# Altium schematic symbol library Oscillators - Crystals.SchLib: 746 symbols (part 4 of 5)
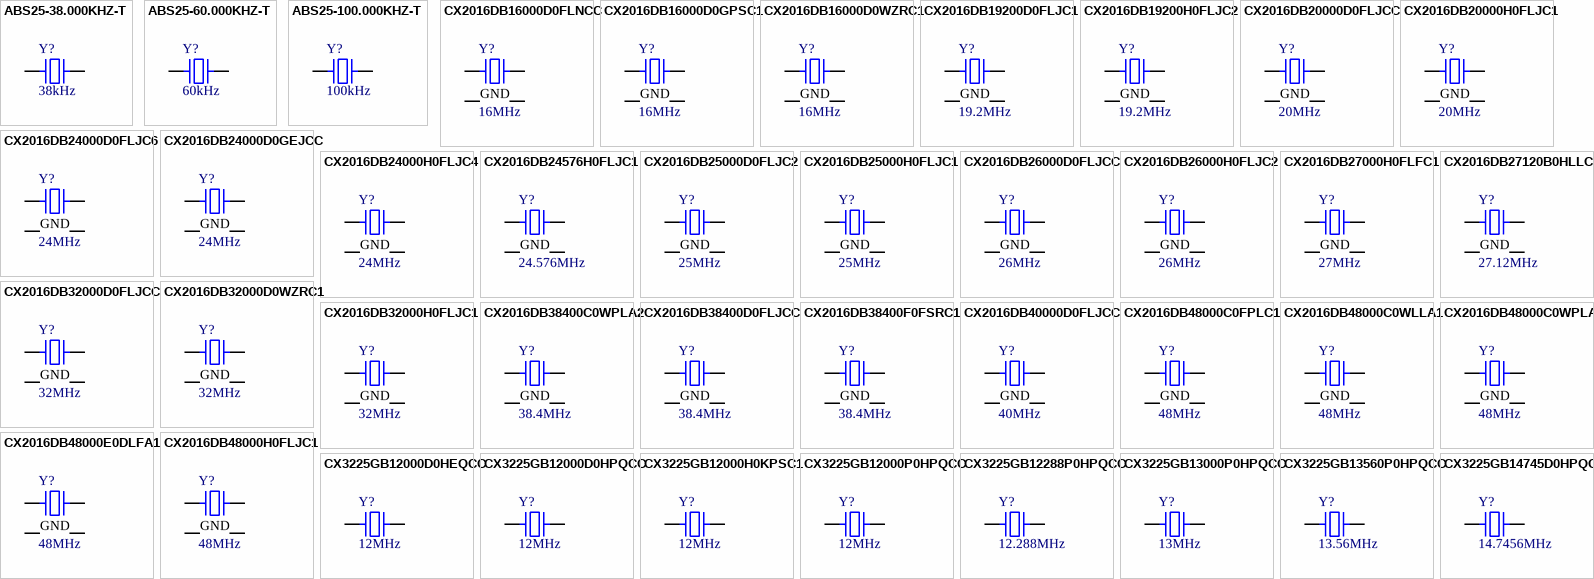
[diagram p21: symbols ABS25-38.000KHZ-T to CX3225GB14745D0HPQCC]

## CX2016DB24000D0FLJC6
designator Y?, comment 24MHz
CRYSTAL 24.0000MHZ 8PF SMD; Part Number: CX2016DB24000D0FLJC6; Manufacturer: Kyocera International Inc. Electronic Components; ESR (Equivalent Series Resistance): 150 Ohms; Frequency Stability: ±15ppm; Frequency Tolerance: ±10ppm; Operating Mode: Fundamental; ComponentLink1Description: Datasheet; ComponentLink1URL: //media.digikey.com/pdf/Data%20Sheets/AVX%20PDFs/CX2016DB_USY1M-H1-16424-00_Spec.pdf; ComponentLink2Description: DigiKey Link; ComponentLink2URL: http://digikey.com/product-detail/en/kyocera-international-inc-electronic-components/CX2016DB24000D0FLJC6/1253-1705-1-ND/6123332; Frequency: 24MHz; Height - Seated (Max): 0.018" (0.45mm); LastUpdated: 9/2/2020 1:21:56 AM; Lifecycle Status: Active; Load Capacitance: 8pF; Minimum Order: 1; Mounting Type: Surface Mount; Operating Temperature: -30°C ~ 85°C; Package / Case: 4-SMD, No Lead; Packaging: TapeAndReel; PartId: 456; Part Status: Active; Price: 0.36; Series: CX2016DB, Kyocera; Size / Dimension: 0.079" L x 0.063" W (2.00mm x 1.60mm); Supplier 1: DigiKey; Supplier Part Number 1: 1253-1705-1-ND; Type: MHz Crystal; Value: 24MHz
footprint KYOCERA CX2016DB
pins: 1, 2 GND, 3, 4 GND

## CX2016DB24000D0GEJCC
designator Y?, comment 24MHz
CRYSTAL 24.0000MHZ 8PF SMD; Part Number: CX2016DB24000D0GEJCC; Manufacturer: Kyocera International Inc. Electronic Components; ESR (Equivalent Series Resistance): 150 Ohms; Frequency Stability: ±15ppm; Operating Mode: Fundamental; ComponentLink1Description: Datasheet; ComponentLink1URL: https://global.kyocera.com/prdct/electro/product/pdf/cx2016db_e.pdf; ComponentLink2Description: DigiKey Link; ComponentLink2URL: http://digikey.com/product-detail/en/kyocera-international-inc-electronic-components/CX2016DB24000D0GEJCC/1253-1114-1-ND/4453932; Frequency: 24MHz; Frequency Tolerance: ±15ppm; Height - Seated (Max): 0.018" (0.45mm); LastUpdated: 9/2/2020 1:21:56 AM; Lifecycle Status: Active; Load Capacitance: 8pF; Minimum Order: 1; Mounting Type: Surface Mount; Operating Temperature: -10°C ~ 70°C; Package / Case: 4-SMD, No Lead; Packaging: TapeAndReel; PartId: 469; Part Status: Active; Price: 0.45; Series: CX2016DB, Kyocera; Size / Dimension: 0.079" L x 0.063" W (2.00mm x 1.60mm); Supplier 1: DigiKey; Supplier Part Number 1: 1253-1114-1-ND; Type: MHz Crystal; Value: 24MHz
footprint KYOCERA CX2016DB
pins: 1, 2 GND, 3, 4 GND

## CX2016DB24000H0FLJC4
designator Y?, comment 24MHz
CRYSTAL 24.0000MHZ 12PF SMD; Part Number: CX2016DB24000H0FLJC4; Manufacturer: Kyocera International Inc. Electronic Components; ESR (Equivalent Series Resistance): 150 Ohms; Frequency Stability: ±15ppm; Frequency Tolerance: ±10ppm; Operating Mode: Fundamental; ComponentLink1Description: Datasheet; ComponentLink1URL: //media.digikey.com/pdf/Data%20Sheets/AVX%20PDFs/CX2016DB_USY1M-H1-16426-00_Spec.pdf; ComponentLink2Description: DigiKey Link; ComponentLink2URL: http://digikey.com/product-detail/en/kyocera-international-inc-electronic-components/CX2016DB24000H0FLJC4/1253-1706-1-ND/6123333; Frequency: 24MHz; Height - Seated (Max): 0.018" (0.45mm); LastUpdated: 9/2/2020 1:21:56 AM; Lifecycle Status: Active; Load Capacitance: 12pF; Minimum Order: 1; Mounting Type: Surface Mount; Operating Temperature: -30°C ~ 85°C; Package / Case: 4-SMD, No Lead; Packaging: TapeAndReel; PartId: 476; Part Status: Active; Price: 0.36; Series: CX2016DB, Kyocera; Size / Dimension: 0.079" L x 0.063" W (2.00mm x 1.60mm); Supplier 1: DigiKey; Supplier Part Number 1: 1253-1706-1-ND; Type: MHz Crystal; Value: 24MHz
footprint KYOCERA CX2016DB
pins: 1, 2 GND, 3, 4 GND

## CX2016DB24576H0FLJC1
designator Y?, comment 24.576MHz
CRYSTAL 24.5760MHZ 12PF SMD; Part Number: CX2016DB24576H0FLJC1; Manufacturer: Kyocera International Inc. Electronic Components; ESR (Equivalent Series Resistance): 150 Ohms; Frequency Stability: ±15ppm; Frequency Tolerance: ±10ppm; Operating Mode: Fundamental; ComponentLink1Description: Datasheet; ComponentLink1URL: //media.digikey.com/pdf/Data%20Sheets/AVX%20PDFs/CX2016DB_USY1M-H1-16426-00_Spec.pdf; ComponentLink2Description: DigiKey Link; ComponentLink2URL: http://digikey.com/product-detail/en/kyocera-international-inc-electronic-components/CX2016DB24576H0FLJC1/1253-1707-1-ND/6123334; Frequency: 24.576MHz; Height - Seated (Max): 0.018" (0.45mm); LastUpdated: 9/2/2020 1:21:56 AM; Lifecycle Status: Active; Load Capacitance: 12pF; Minimum Order: 1; Mounting Type: Surface Mount; Operating Temperature: -30°C ~ 85°C; Package / Case: 4-SMD, No Lead; Packaging: TapeAndReel; PartId: 457; Part Status: Active; Price: 0.36; Series: CX2016DB, Kyocera; Size / Dimension: 0.079" L x 0.063" W (2.00mm x 1.60mm); Supplier 1: DigiKey; Supplier Part Number 1: 1253-1707-1-ND; Type: MHz Crystal; Value: 24.576MHz
footprint KYOCERA CX2016DB
pins: 1, 2 GND, 3, 4 GND

## CX2016DB25000D0FLJC2
designator Y?, comment 25MHz
CRYSTAL 25.0000MHZ 8PF SMD; Part Number: CX2016DB25000D0FLJC2; Manufacturer: Kyocera International Inc. Electronic Components; ESR (Equivalent Series Resistance): 150 Ohms; Frequency Stability: ±15ppm; Frequency Tolerance: ±10ppm; Operating Mode: Fundamental; ComponentLink1Description: Datasheet; ComponentLink1URL: //media.digikey.com/pdf/Data%20Sheets/AVX%20PDFs/CX2016DB_USY1M-H1-16424-00_Spec.pdf; ComponentLink2Description: DigiKey Link; ComponentLink2URL: http://digikey.com/product-detail/en/kyocera-international-inc-electronic-components/CX2016DB25000D0FLJC2/1253-1708-1-ND/6123335; Frequency: 25MHz; Height - Seated (Max): 0.018" (0.45mm); LastUpdated: 9/2/2020 1:21:56 AM; Lifecycle Status: Active; Load Capacitance: 8pF; Minimum Order: 1; Mounting Type: Surface Mount; Operating Temperature: -30°C ~ 85°C; Package / Case: 4-SMD, No Lead; Packaging: TapeAndReel; PartId: 484; Part Status: Active; Price: 0.36; Series: CX2016DB, Kyocera; Size / Dimension: 0.079" L x 0.063" W (2.00mm x 1.60mm); Supplier 1: DigiKey; Supplier Part Number 1: 1253-1708-1-ND; Type: MHz Crystal; Value: 25MHz
footprint KYOCERA CX2016DB
pins: 1, 2 GND, 3, 4 GND

## CX2016DB25000H0FLJC1
designator Y?, comment 25MHz
CRYSTAL 25.0000MHZ 12PF SMD; Part Number: CX2016DB25000H0FLJC1; Manufacturer: Kyocera International Inc. Electronic Components; ESR (Equivalent Series Resistance): 150 Ohms; Frequency Stability: ±15ppm; Frequency Tolerance: ±10ppm; Operating Mode: Fundamental; ComponentLink1Description: Datasheet; ComponentLink1URL: //media.digikey.com/pdf/Data%20Sheets/AVX%20PDFs/CX2016DB_USY1M-H1-16426-00_Spec.pdf; ComponentLink2Description: DigiKey Link; ComponentLink2URL: http://digikey.com/product-detail/en/kyocera-international-inc-electronic-components/CX2016DB25000H0FLJC1/1253-1709-1-ND/6123336; Frequency: 25MHz; Height - Seated (Max): 0.018" (0.45mm); LastUpdated: 9/2/2020 1:21:56 AM; Lifecycle Status: Active; Load Capacitance: 12pF; Minimum Order: 1; Mounting Type: Surface Mount; Operating Temperature: -30°C ~ 85°C; Package / Case: 4-SMD, No Lead; Packaging: TapeAndReel; PartId: 458; Part Status: Active; Price: 0.36; Series: CX2016DB, Kyocera; Size / Dimension: 0.079" L x 0.063" W (2.00mm x 1.60mm); Supplier 1: DigiKey; Supplier Part Number 1: 1253-1709-1-ND; Type: MHz Crystal; Value: 25MHz
footprint KYOCERA CX2016DB
pins: 1, 2 GND, 3, 4 GND

## CX2016DB26000D0FLJCC
designator Y?, comment 26MHz
CRYSTAL 26.0000MHZ 8PF SMD; Part Number: CX2016DB26000D0FLJCC; Manufacturer: Kyocera International Inc. Electronic Components; ESR (Equivalent Series Resistance): 60 Ohms; Frequency Stability: ±15ppm; Frequency Tolerance: ±10ppm; Operating Mode: Fundamental; ComponentLink1Description: Datasheet; ComponentLink1URL: //media.digikey.com/pdf/Data%20Sheets/Optrex%20PDFs/CX2016DB_Series_Spec.pdf; ComponentLink2Description: DigiKey Link; ComponentLink2URL: http://digikey.com/product-detail/en/kyocera-international-inc-electronic-components/CX2016DB26000D0FLJCC/1253-1116-1-ND/4453935; Frequency: 26MHz; Height - Seated (Max): 0.018" (0.45mm); LastUpdated: 9/2/2020 1:21:56 AM; Lifecycle Status: Active; Load Capacitance: 8pF; Minimum Order: 1; Mounting Type: Surface Mount; Operating Temperature: -30°C ~ 85°C; Package / Case: 4-SMD, No Lead; Packaging: TapeAndReel; PartId: 473; Part Status: Active; Price: 0.48; Series: CX2016DB, Kyocera; Size / Dimension: 0.079" L x 0.063" W (2.00mm x 1.60mm); Supplier 1: DigiKey; Supplier Part Number 1: 1253-1116-1-ND; Type: MHz Crystal; Value: 26MHz
footprint KYOCERA CX2016DB
pins: 1, 2 GND, 3, 4 GND

## CX2016DB26000H0FLJC2
designator Y?, comment 26MHz
CRYSTAL 26.0000MHZ 12PF SMD; Part Number: CX2016DB26000H0FLJC2; Manufacturer: Kyocera International Inc. Electronic Components; ESR (Equivalent Series Resistance): 60 Ohms; Frequency Stability: ±15ppm; Frequency Tolerance: ±10ppm; Operating Mode: Fundamental; ComponentLink1Description: Datasheet; ComponentLink1URL: //media.digikey.com/pdf/Data%20Sheets/AVX%20PDFs/CX2016DB_USY1M-H1-16426-00_Spec.pdf; ComponentLink2Description: DigiKey Link; ComponentLink2URL: http://digikey.com/product-detail/en/kyocera-international-inc-electronic-components/CX2016DB26000H0FLJC2/1253-1710-1-ND/6123337; Frequency: 26MHz; Height - Seated (Max): 0.018" (0.45mm); LastUpdated: 9/2/2020 1:21:56 AM; Lifecycle Status: Active; Load Capacitance: 12pF; Minimum Order: 1; Mounting Type: Surface Mount; Operating Temperature: -30°C ~ 85°C; Package / Case: 4-SMD, No Lead; Packaging: TapeAndReel; PartId: 475; Part Status: Active; Price: 0.36; Series: CX2016DB, Kyocera; Size / Dimension: 0.079" L x 0.063" W (2.00mm x 1.60mm); Supplier 1: DigiKey; Supplier Part Number 1: 1253-1710-1-ND; Type: MHz Crystal; Value: 26MHz
footprint KYOCERA CX2016DB
pins: 1, 2 GND, 3, 4 GND

## CX2016DB27000H0FLFC1
designator Y?, comment 27MHz
CRYSTAL 27.0000MHZ 12PF SMD; Part Number: CX2016DB27000H0FLFC1; Manufacturer: Kyocera International Inc. Electronic Components; ESR (Equivalent Series Resistance): 60 Ohms; Frequency Stability: ±15ppm; Frequency Tolerance: ±10ppm; Operating Mode: Fundamental; ComponentLink1Description: Datasheet; ComponentLink1URL: https://global.kyocera.com/prdct/electro/product/pdf/cx2016db_e.pdf; ComponentLink2Description: DigiKey Link; ComponentLink2URL: http://digikey.com/product-detail/en/kyocera-international-inc-electronic-components/CX2016DB27000H0FLFC1/1253-1347-1-ND/4896437; Frequency: 27MHz; Height - Seated (Max): 0.018" (0.45mm); LastUpdated: 9/2/2020 1:21:56 AM; Lifecycle Status: Active; Load Capacitance: 12pF; Minimum Order: 1; Mounting Type: Surface Mount; Operating Temperature: -30°C ~ 85°C; Package / Case: 4-SMD, No Lead; Packaging: TapeAndReel; PartId: 482; Part Status: Active; Price: 0.33; Series: CX2016DB, Kyocera; Size / Dimension: 0.079" L x 0.063" W (2.00mm x 1.60mm); Supplier 1: DigiKey; Supplier Part Number 1: 1253-1347-1-ND; Type: MHz Crystal; Value: 27MHz
footprint KYOCERA CX2016DB
pins: 1, 2 GND, 3, 4 GND

## CX2016DB27120B0HLLC1
designator Y?, comment 27.12MHz
CRYSTAL 27.1200MHZ 6PF SMD; Part Number: CX2016DB27120B0HLLC1; Manufacturer: Kyocera International Inc. Electronic Components; ESR (Equivalent Series Resistance): 60 Ohms; Frequency Tolerance: ±20ppm; Operating Mode: Fundamental; ComponentLink2Description: DigiKey Link; ComponentLink2URL: http://digikey.com/product-detail/en/kyocera-international-inc-electronic-components/CX2016DB27120B0HLLC1/1253-1697-1-ND/5995244; Frequency: 27.12MHz; Height - Seated (Max): 0.018" (0.45mm); LastUpdated: 9/2/2020 1:21:56 AM; Lifecycle Status: Active; Load Capacitance: 6pF; Minimum Order: 1; Mounting Type: Surface Mount; Operating Temperature: -30°C ~ 85°C; Package / Case: 4-SMD, No Lead; Packaging: TapeAndReel; PartId: 463; Part Status: Active; Price: 0.30; Series: CX2016DB, Kyocera; Size / Dimension: 0.079" L x 0.063" W (2.00mm x 1.60mm); Supplier 1: DigiKey; Supplier Part Number 1: 1253-1697-1-ND; Type: MHz Crystal; Value: 27.12MHz
footprint KYOCERA CX2016DB
pins: 1, 2 GND, 3, 4 GND

## CX2016DB32000D0FLJCC
designator Y?, comment 32MHz
CRYSTAL 32.0000MHZ 8PF SMD; Part Number: CX2016DB32000D0FLJCC; Manufacturer: Kyocera International Inc. Electronic Components; ESR (Equivalent Series Resistance): 60 Ohms; Frequency Stability: ±15ppm; Frequency Tolerance: ±10ppm; Operating Mode: Fundamental; ComponentLink1Description: Datasheet; ComponentLink1URL: //media.digikey.com/pdf/Data%20Sheets/Optrex%20PDFs/CX2016DB_Series_Spec.pdf; ComponentLink2Description: DigiKey Link; ComponentLink2URL: http://digikey.com/product-detail/en/kyocera-international-inc-electronic-components/CX2016DB32000D0FLJCC/1253-1118-1-ND/4453936; Frequency: 32MHz; Height - Seated (Max): 0.018" (0.45mm); LastUpdated: 9/2/2020 1:21:56 AM; Lifecycle Status: Active; Load Capacitance: 8pF; Minimum Order: 1; Mounting Type: Surface Mount; Operating Temperature: -30°C ~ 85°C; Package / Case: 4-SMD, No Lead; Packaging: TapeAndReel; PartId: 470; Part Status: Active; Price: 0.48; Series: CX2016DB, Kyocera; Size / Dimension: 0.079" L x 0.063" W (2.00mm x 1.60mm); Supplier 1: DigiKey; Supplier Part Number 1: 1253-1118-1-ND; Type: MHz Crystal; Value: 32MHz
footprint KYOCERA CX2016DB
pins: 1, 2 GND, 3, 4 GND

## CX2016DB32000D0WZRC1
designator Y?, comment 32MHz
CRYSTAL 32.0000MHZ 8PF SMD; Part Number: CX2016DB32000D0WZRC1; Manufacturer: Kyocera International Inc. Electronic Components; ESR (Equivalent Series Resistance): 60 Ohms; Frequency Stability: ±40ppm; Frequency Tolerance: ±25ppm; Operating Mode: Fundamental; ComponentLink1Description: Datasheet; ComponentLink1URL: https://global.kyocera.com/prdct/electro/product/pdf/cx2016db_e.pdf; ComponentLink2Description: DigiKey Link; ComponentLink2URL: http://digikey.com/product-detail/en/kyocera-international-inc-electronic-components/CX2016DB32000D0WZRC1/1253-1586-1-ND/5436848; Frequency: 32MHz; Height - Seated (Max): 0.018" (0.45mm); LastUpdated: 9/2/2020 1:21:56 AM; Lifecycle Status: Active; Load Capacitance: 8pF; Minimum Order: 1; Mounting Type: Surface Mount; Operating Temperature: -25°C ~ 75°C; Package / Case: 4-SMD, No Lead; Packaging: TapeAndReel; PartId: 466; Part Status: Active; Price: 0.36; Series: CX2016DB, Kyocera; Size / Dimension: 0.079" L x 0.063" W (2.00mm x 1.60mm); Supplier 1: DigiKey; Supplier Part Number 1: 1253-1586-1-ND; Type: MHz Crystal; Value: 32MHz
footprint KYOCERA CX2016DB
pins: 1, 2 GND, 3, 4 GND

## CX2016DB32000H0FLJC1
designator Y?, comment 32MHz
CRYSTAL 32.0000MHZ 12PF SMD; Part Number: CX2016DB32000H0FLJC1; Manufacturer: Kyocera International Inc. Electronic Components; ESR (Equivalent Series Resistance): 60 Ohms; Frequency Stability: ±15ppm; Frequency Tolerance: ±10ppm; Operating Mode: Fundamental; ComponentLink1Description: Datasheet; ComponentLink1URL: //media.digikey.com/pdf/Data%20Sheets/AVX%20PDFs/CX2016DB_USY1M-H1-16426-00_Spec.pdf; ComponentLink2Description: DigiKey Link; ComponentLink2URL: http://digikey.com/product-detail/en/kyocera-international-inc-electronic-components/CX2016DB32000H0FLJC1/1253-1711-1-ND/6123338; Frequency: 32MHz; Height - Seated (Max): 0.018" (0.45mm); LastUpdated: 9/2/2020 1:21:56 AM; Lifecycle Status: Active; Load Capacitance: 12pF; Minimum Order: 1; Mounting Type: Surface Mount; Operating Temperature: -30°C ~ 85°C; Package / Case: 4-SMD, No Lead; Packaging: TapeAndReel; PartId: 478; Part Status: Active; Price: 0.36; Series: CX2016DB, Kyocera; Size / Dimension: 0.079" L x 0.063" W (2.00mm x 1.60mm); Supplier 1: DigiKey; Supplier Part Number 1: 1253-1711-1-ND; Type: MHz Crystal; Value: 32MHz
footprint KYOCERA CX2016DB
pins: 1, 2 GND, 3, 4 GND

## CX2016DB38400C0WPLA2
designator Y?, comment 38.4MHz
CRYSTAL 38.4000MHZ 7PF SMD; Part Number: CX2016DB38400C0WPLA2; Manufacturer: Kyocera International Inc. Electronic Components; ESR (Equivalent Series Resistance): 60 Ohms; Frequency Stability: ±20ppm; Operating Mode: Fundamental; ComponentLink1Description: Datasheet; ComponentLink1URL: https://global.kyocera.com/prdct/electro/product/pdf/cx2016db_e.pdf; ComponentLink2Description: DigiKey Link; ComponentLink2URL: http://digikey.com/product-detail/en/kyocera-international-inc-electronic-components/CX2016DB38400C0WPLA2/1253-1782-1-ND/6554924; Frequency: 38.4MHz; Frequency Tolerance: ±20ppm; Height - Seated (Max): 0.018" (0.45mm); LastUpdated: 9/2/2020 1:21:56 AM; Lifecycle Status: Active; Load Capacitance: 7pF; Minimum Order: 1; Mounting Type: Surface Mount; Operating Temperature: -40°C ~ 85°C; Package / Case: 4-SMD, No Lead; Packaging: TapeAndReel; PartId: 464; Part Status: Active; Price: 0.32; Series: CX2016DB, Kyocera; Size / Dimension: 0.079" L x 0.063" W (2.00mm x 1.60mm); Supplier 1: DigiKey; Supplier Part Number 1: 1253-1782-1-ND; Type: MHz Crystal; Value: 38.4MHz
footprint KYOCERA CX2016DB
pins: 1, 2 GND, 3, 4 GND

## CX2016DB38400D0FLJCC
designator Y?, comment 38.4MHz
CRYSTAL 38.4000MHZ 8PF SMD; Part Number: CX2016DB38400D0FLJCC; Manufacturer: Kyocera International Inc. Electronic Components; ESR (Equivalent Series Resistance): 60 Ohms; Frequency Stability: ±15ppm; Frequency Tolerance: ±10ppm; Operating Mode: Fundamental; ComponentLink1Description: Datasheet; ComponentLink1URL: //media.digikey.com/pdf/Data%20Sheets/Optrex%20PDFs/CX2016DB_Series_Spec.pdf; ComponentLink2Description: DigiKey Link; ComponentLink2URL: http://digikey.com/product-detail/en/kyocera-international-inc-electronic-components/CX2016DB38400D0FLJCC/1253-1119-1-ND/4453937; Frequency: 38.4MHz; Height - Seated (Max): 0.018" (0.45mm); LastUpdated: 9/2/2020 1:21:56 AM; Lifecycle Status: Active; Load Capacitance: 8pF; Minimum Order: 1; Mounting Type: Surface Mount; Operating Temperature: -30°C ~ 85°C; Package / Case: 4-SMD, No Lead; Packaging: TapeAndReel; PartId: 465; Part Status: Active; Price: 0.36; Series: CX2016DB, Kyocera; Size / Dimension: 0.079" L x 0.063" W (2.00mm x 1.60mm); Supplier 1: DigiKey; Supplier Part Number 1: 1253-1119-1-ND; Type: MHz Crystal; Value: 38.4MHz
footprint KYOCERA CX2016DB
pins: 1, 2 GND, 3, 4 GND

## CX2016DB38400F0FSRC1
designator Y?, comment 38.4MHz
CRYSTAL 38.4MHZ 10PF; Part Number: CX2016DB38400F0FSRC1; Manufacturer: Kyocera International Inc. Electronic Components; ESR (Equivalent Series Resistance): 40 Ohms; Frequency Stability: ±40ppm; Frequency Tolerance: ±10ppm; Operating Mode: Fundamental; ComponentLink1Description: Datasheet; ComponentLink1URL: //media.digikey.com/pdf/Data%20Sheets/Kyocera%20International/CX2016DB38400F0FSRC1_Prelim.pdf; ComponentLink2Description: DigiKey Link; ComponentLink2URL: http://digikey.com/product-detail/en/kyocera-international-inc-electronic-components/CX2016DB38400F0FSRC1/1253-2044-1-ND/9749122; Frequency: 38.4MHz; Height - Seated (Max): 0.018" (0.45mm); LastUpdated: 9/2/2020 1:21:56 AM; Lifecycle Status: Active; Load Capacitance: 10pF; Minimum Order: 1; Mounting Type: Surface Mount; Operating Temperature: -40°C ~ 125°C; Package / Case: 4-SMD, No Lead; Packaging: TapeAndReel; PartId: 460; Part Status: Active; Price: 0.58; Series: CX2016DB, Kyocera; Size / Dimension: 0.079" L x 0.063" W (2.00mm x 1.60mm); Supplier 1: DigiKey; Supplier Part Number 1: 1253-2044-1-ND; Type: MHz Crystal; Value: 38.4MHz
footprint KYOCERA CX2016DB
pins: 1, 2 GND, 3, 4 GND

## CX2016DB40000D0FLJCC
designator Y?, comment 40MHz
CRYSTAL 40.0000MHZ 8PF SMD; Part Number: CX2016DB40000D0FLJCC; Manufacturer: Kyocera International Inc. Electronic Components; ESR (Equivalent Series Resistance): 50 Ohms; Frequency Stability: ±15ppm; Frequency Tolerance: ±10ppm; Operating Mode: Fundamental; ComponentLink1Description: Datasheet; ComponentLink1URL: //media.digikey.com/pdf/Data%20Sheets/Optrex%20PDFs/CX2016DB_Series_Spec.pdf; ComponentLink2Description: DigiKey Link; ComponentLink2URL: http://digikey.com/product-detail/en/kyocera-international-inc-electronic-components/CX2016DB40000D0FLJCC/1253-1120-1-ND/4453938; Frequency: 40MHz; Height - Seated (Max): 0.018" (0.45mm); LastUpdated: 9/2/2020 1:21:56 AM; Lifecycle Status: Active; Load Capacitance: 8pF; Minimum Order: 1; Mounting Type: Surface Mount; Operating Temperature: -30°C ~ 85°C; Package / Case: 4-SMD, No Lead; Packaging: TapeAndReel; PartId: 471; Part Status: Active; Price: 0.48; Series: CX2016DB, Kyocera; Size / Dimension: 0.079" L x 0.063" W (2.00mm x 1.60mm); Supplier 1: DigiKey; Supplier Part Number 1: 1253-1120-1-ND; Type: MHz Crystal; Value: 40MHz
footprint KYOCERA CX2016DB
pins: 1, 2 GND, 3, 4 GND

## CX2016DB48000C0FPLC1
designator Y?, comment 48MHz
CRYSTAL 48MHZ SMD; Part Number: CX2016DB48000C0FPLC1; Manufacturer: Kyocera International Inc. Electronic Components; ESR (Equivalent Series Resistance): 50 Ohms; Frequency Stability: ±20ppm; Frequency Tolerance: ±10ppm; Load Capacitance: 7pF; Operating Mode: Fundamental; ComponentLink1Description: Datasheet; ComponentLink1URL: //media.digikey.com/pdf/Data%20Sheets/Kyocera%20International/CX2016DB48000C0FPLC1_DS.pdf; ComponentLink2Description: DigiKey Link; ComponentLink2URL: http://digikey.com/product-detail/en/kyocera-international-inc-electronic-components/CX2016DB48000C0FPLC1/1253-2042-1-ND/9698139; Frequency: 48MHz; Height - Seated (Max): 0.018" (0.45mm); LastUpdated: 9/2/2020 1:21:56 AM; Lifecycle Status: Active; Minimum Order: 1; Mounting Type: Surface Mount; Operating Temperature: -40°C ~ 85°C; Package / Case: 4-SMD, No Lead; Packaging: TapeAndReel; PartId: 459; Part Status: Active; Price: 0.38; Series: CX2016DB, Kyocera; Size / Dimension: 0.079" L x 0.063" W (2.00mm x 1.60mm); Supplier 1: DigiKey; Supplier Part Number 1: 1253-2042-1-ND; Type: MHz Crystal; Value: 48MHz
footprint KYOCERA CX2016DB
pins: 1, 2 GND, 3, 4 GND

## CX2016DB48000C0WLLA1
designator Y?, comment 48MHz
CRYSTAL 48MHZ 7PF SMD; Part Number: CX2016DB48000C0WLLA1; Manufacturer: Kyocera International Inc. Electronic Components; ESR (Equivalent Series Resistance): 50 Ohms; Frequency Stability: ±20ppm; Operating Mode: Fundamental; ComponentLink1Description: Datasheet; ComponentLink1URL: https://global.kyocera.com/prdct/electro/product/pdf/cx2016db_e.pdf; ComponentLink2Description: DigiKey Link; ComponentLink2URL: http://digikey.com/product-detail/en/kyocera-international-inc-electronic-components/CX2016DB48000C0WLLA1/1253-1388-1-ND/5181912; Frequency: 48MHz; Frequency Tolerance: ±20ppm; Height - Seated (Max): 0.018" (0.45mm); LastUpdated: 9/2/2020 1:21:56 AM; Lifecycle Status: Active; Load Capacitance: 7pF; Minimum Order: 1; Mounting Type: Surface Mount; Operating Temperature: -30°C ~ 85°C; Package / Case: 4-SMD, No Lead; Packaging: TapeAndReel; PartId: 483; Part Status: Active; Price: 0.41; Series: CX2016DB, Kyocera; Size / Dimension: 0.079" L x 0.063" W (2.00mm x 1.60mm); Supplier 1: DigiKey; Supplier Part Number 1: 1253-1388-1-ND; Type: MHz Crystal; Value: 48MHz
footprint KYOCERA CX2016DB
pins: 1, 2 GND, 3, 4 GND

## CX2016DB48000C0WPLA2
designator Y?, comment 48MHz
CRYSTAL 48.0000MHZ 7PF SMD; Part Number: CX2016DB48000C0WPLA2; Manufacturer: Kyocera International Inc. Electronic Components; ESR (Equivalent Series Resistance): 50 Ohms; Frequency Stability: ±15ppm; Frequency Tolerance: ±20ppm; Operating Mode: Fundamental; ComponentLink1Description: Datasheet; ComponentLink1URL: https://global.kyocera.com/prdct/electro/product/pdf/cx2016db_e.pdf; ComponentLink2Description: DigiKey Link; ComponentLink2URL: http://digikey.com/product-detail/en/kyocera-international-inc-electronic-components/CX2016DB48000C0WPLA2/1253-1345-1-ND/4896435; Frequency: 48MHz; Height - Seated (Max): 0.018" (0.45mm); LastUpdated: 9/2/2020 1:21:56 AM; Lifecycle Status: Active; Load Capacitance: 7pF; Minimum Order: 1; Mounting Type: Surface Mount; Operating Temperature: -40°C ~ 85°C; Package / Case: 4-SMD, No Lead; Packaging: TapeAndReel; PartId: 472; Part Status: Active; Price: 0.48; Series: CX2016DB, Kyocera; Size / Dimension: 0.079" L x 0.063" W (2.00mm x 1.60mm); Supplier 1: DigiKey; Supplier Part Number 1: 1253-1345-1-ND; Type: MHz Crystal; Value: 48MHz
footprint KYOCERA CX2016DB
pins: 1, 2 GND, 3, 4 GND

## CX2016DB48000E0DLFA1
designator Y?, comment 48MHz
CRYSTALS 48.0000MHZ 9PF SMD; Part Number: CX2016DB48000E0DLFA1; Manufacturer: Kyocera International Inc. Electronic Components; ESR (Equivalent Series Resistance): 50 Ohms; Frequency Stability: ±10ppm; Frequency Tolerance: ±8ppm; Load Capacitance: 11.1pF; Operating Mode: Fundamental; ComponentLink1Description: Datasheet; ComponentLink1URL: //media.digikey.com/pdf/Data%20Sheets/AVX%20PDFs/CX2016DB48000E0DLFA1_Spec.pdf; ComponentLink2Description: DigiKey Link; ComponentLink2URL: http://digikey.com/product-detail/en/kyocera-international-inc-electronic-components/CX2016DB48000E0DLFA1/1253-1783-1-ND/6563405; Frequency: 48MHz; Height - Seated (Max): 0.018" (0.45mm); LastUpdated: 9/2/2020 1:21:56 AM; Lifecycle Status: Active; Minimum Order: 1; Mounting Type: Surface Mount; Operating Temperature: -30°C ~ 85°C; Package / Case: 4-SMD, No Lead; Packaging: TapeAndReel; PartId: 462; Part Status: Active; Price: 0.59; Series: CX2016DB, Kyocera; Size / Dimension: 0.079" L x 0.063" W (2.00mm x 1.60mm); Supplier 1: DigiKey; Supplier Part Number 1: 1253-1783-1-ND; Type: MHz Crystal; Value: 48MHz
footprint KYOCERA CX2016DB
pins: 1, 2 GND, 3, 4 GND

## CX2016DB48000H0FLJC1
designator Y?, comment 48MHz
CRYSTAL 48.0000MHZ 12PF SMD; Part Number: CX2016DB48000H0FLJC1; Manufacturer: Kyocera International Inc. Electronic Components; ESR (Equivalent Series Resistance): 50 Ohms; Frequency Stability: ±15ppm; Frequency Tolerance: ±10ppm; Operating Mode: Fundamental; ComponentLink1Description: Datasheet; ComponentLink1URL: //media.digikey.com/pdf/Data%20Sheets/AVX%20PDFs/CX2016DB_USY1M-H1-16426-00_Spec.pdf; ComponentLink2Description: DigiKey Link; ComponentLink2URL: http://digikey.com/product-detail/en/kyocera-international-inc-electronic-components/CX2016DB48000H0FLJC1/1253-1712-1-ND/6123339; Frequency: 48MHz; Height - Seated (Max): 0.018" (0.45mm); LastUpdated: 9/2/2020 1:21:56 AM; Lifecycle Status: Active; Load Capacitance: 12pF; Minimum Order: 1; Mounting Type: Surface Mount; Operating Temperature: -30°C ~ 85°C; Package / Case: 4-SMD, No Lead; Packaging: TapeAndReel; PartId: 480; Part Status: Active; Price: 0.36; Series: CX2016DB, Kyocera; Size / Dimension: 0.079" L x 0.063" W (2.00mm x 1.60mm); Supplier 1: DigiKey; Supplier Part Number 1: 1253-1712-1-ND; Type: MHz Crystal; Value: 48MHz
footprint KYOCERA CX2016DB
pins: 1, 2 GND, 3, 4 GND

## CX3225GB12000D0HEQCC
designator Y?, comment 12MHz
CRYSTAL 12.0000MHZ 8PF SMD; Part Number: CX3225GB12000D0HEQCC; Manufacturer: Kyocera International Inc. Electronic Components; ESR (Equivalent Series Resistance): 250 Ohms; Frequency Stability: ±30ppm; Frequency Tolerance: ±20ppm; Operating Mode: Fundamental; ComponentLink1Description: Datasheet; ComponentLink1URL: //media.digikey.com/pdf/Data%20Sheets/AVX%20PDFs/CX3225GBxD0HEQ_Series_Spec.pdf; ComponentLink2Description: DigiKey Link; ComponentLink2URL: http://digikey.com/product-detail/en/kyocera-international-inc-electronic-components/CX3225GB12000D0HEQCC/1253-1166-1-ND/4453982; Frequency: 12MHz; Height - Seated (Max): 0.035" (0.90mm); LastUpdated: 9/2/2020 1:21:57 AM; Lifecycle Status: Active; Load Capacitance: 8pF; Minimum Order: 1; Mounting Type: Surface Mount; Operating Temperature: -10°C ~ 70°C; Package / Case: 4-SMD, No Lead; Packaging: TapeAndReel; PartId: 487; Part Status: Active; Price: 0.33; Series: CX3225GB, Kyocera; Size / Dimension: 0.126" L x 0.098" W (3.20mm x 2.50mm); Supplier 1: DigiKey; Supplier Part Number 1: 1253-1166-1-ND; Type: MHz Crystal; Value: 12MHz
footprint KYOCERA CX3225GB
pins: 1, 3

## CX3225GB12000D0HPQCC
designator Y?, comment 12MHz
CRYSTAL 12.0000MHZ 8PF SMD; Part Number: CX3225GB12000D0HPQCC; Manufacturer: Kyocera International Inc. Electronic Components; ESR (Equivalent Series Resistance): 250 Ohms; Frequency Stability: ±30ppm; Frequency Tolerance: ±20ppm; Operating Mode: Fundamental; ComponentLink1Description: Datasheet; ComponentLink1URL: //media.digikey.com/pdf/Data%20Sheets/AVX%20PDFs/CX3225GBxD0HPQCC_Series_Spec.pdf; ComponentLink2Description: DigiKey Link; ComponentLink2URL: http://digikey.com/product-detail/en/kyocera-international-inc-electronic-components/CX3225GB12000D0HPQCC/1253-1167-1-ND/4454003; Frequency: 12MHz; Height - Seated (Max): 0.035" (0.90mm); LastUpdated: 9/2/2020 1:21:57 AM; Lifecycle Status: Active; Load Capacitance: 8pF; Minimum Order: 1; Mounting Type: Surface Mount; Operating Temperature: -40°C ~ 85°C; Package / Case: 4-SMD, No Lead; Packaging: TapeAndReel; PartId: 489; Part Status: Active; Price: 0.35; Series: CX3225GB, Kyocera; Size / Dimension: 0.126" L x 0.098" W (3.20mm x 2.50mm); Supplier 1: DigiKey; Supplier Part Number 1: 1253-1167-1-ND; Type: MHz Crystal; Value: 12MHz
footprint KYOCERA CX3225GB
pins: 1, 3

## CX3225GB12000H0KPSC1
designator Y?, comment 12MHz
CRYSTAL 12.0000MHZ 12PF SMD; Part Number: CX3225GB12000H0KPSC1; Manufacturer: Kyocera International Inc. Electronic Components; ESR (Equivalent Series Resistance): 150 Ohms; Frequency Stability: ±50ppm; Frequency Tolerance: ±30ppm; Operating Mode: Fundamental; ComponentLink1Description: Datasheet; ComponentLink1URL: //media.digikey.com/pdf/Data%20Sheets/AVX%20PDFs/CX3225GB12000H0KPSC1_Spec.pdf; ComponentLink2Description: DigiKey Link; ComponentLink2URL: http://digikey.com/product-detail/en/kyocera-international-inc-electronic-components/CX3225GB12000H0KPSC1/1253-1596-1-ND/5765377; Frequency: 12MHz; Height - Seated (Max): 0.035" (0.90mm); LastUpdated: 9/2/2020 1:21:57 AM; Lifecycle Status: Active; Load Capacitance: 12pF; Minimum Order: 1; Mounting Type: Surface Mount; Operating Temperature: -40°C ~ 85°C; Package / Case: 4-SMD, No Lead; Packaging: TapeAndReel; PartId: 503; Part Status: Active; Price: 0.32; Series: CX3225GB, Kyocera; Size / Dimension: 0.126" L x 0.098" W (3.20mm x 2.50mm); Supplier 1: DigiKey; Supplier Part Number 1: 1253-1596-1-ND; Type: MHz Crystal; Value: 12MHz
footprint KYOCERA CX3225GB
pins: 1, 3

## CX3225GB12000P0HPQCC
designator Y?, comment 12MHz
CRYSTAL 12.0000MHZ 18PF SMD; Part Number: CX3225GB12000P0HPQCC; Manufacturer: Kyocera International Inc. Electronic Components; ESR (Equivalent Series Resistance): 250 Ohms; Frequency Stability: ±30ppm; Frequency Tolerance: ±20ppm; Operating Mode: Fundamental; ComponentLink1Description: Datasheet; ComponentLink1URL: //media.digikey.com/pdf/Data%20Sheets/AVX%20PDFs/CX3225GB_Series_Spec.pdf; ComponentLink2Description: DigiKey Link; ComponentLink2URL: http://digikey.com/product-detail/en/kyocera-international-inc-electronic-components/CX3225GB12000P0HPQCC/1253-1168-1-ND/4454024; Frequency: 12MHz; Height - Seated (Max): 0.035" (0.90mm); LastUpdated: 9/2/2020 1:21:57 AM; Lifecycle Status: Active; Load Capacitance: 18pF; Minimum Order: 1; Mounting Type: Surface Mount; Operating Temperature: -40°C ~ 85°C; Package / Case: 4-SMD, No Lead; Packaging: TapeAndReel; PartId: 492; Part Status: Active; Price: 0.35; Series: CX3225GB, Kyocera; Size / Dimension: 0.126" L x 0.098" W (3.20mm x 2.50mm); Supplier 1: DigiKey; Supplier Part Number 1: 1253-1168-1-ND; Type: MHz Crystal; Value: 12MHz
footprint KYOCERA CX3225GB
pins: 1, 3

## CX3225GB12288P0HPQCC
designator Y?, comment 12.288MHz
CRYSTAL 12.2880MHZ 18PF SMD; Part Number: CX3225GB12288P0HPQCC; Manufacturer: Kyocera International Inc. Electronic Components; ESR (Equivalent Series Resistance): 250 Ohms; Frequency Stability: ±30ppm; Frequency Tolerance: ±20ppm; Operating Mode: Fundamental; ComponentLink1Description: Datasheet; ComponentLink1URL: //media.digikey.com/pdf/Data%20Sheets/AVX%20PDFs/CX3225GB_Series_Spec.pdf; ComponentLink2Description: DigiKey Link; ComponentLink2URL: http://digikey.com/product-detail/en/kyocera-international-inc-electronic-components/CX3225GB12288P0HPQCC/1253-1169-1-ND/4454025; Frequency: 12.288MHz; Height - Seated (Max): 0.035" (0.90mm); LastUpdated: 9/2/2020 1:21:57 AM; Lifecycle Status: Active; Load Capacitance: 18pF; Minimum Order: 1; Mounting Type: Surface Mount; Operating Temperature: -40°C ~ 85°C; Package / Case: 4-SMD, No Lead; Packaging: TapeAndReel; PartId: 509; Part Status: Active; Price: 0.41; Series: CX3225GB, Kyocera; Size / Dimension: 0.126" L x 0.098" W (3.20mm x 2.50mm); Supplier 1: DigiKey; Supplier Part Number 1: 1253-1169-1-ND; Type: MHz Crystal; Value: 12.288MHz
footprint KYOCERA CX3225GB
pins: 1, 3

## CX3225GB13000P0HPQCC
designator Y?, comment 13MHz
CRYSTAL 13.0000MHZ 18PF SMD; Part Number: CX3225GB13000P0HPQCC; Manufacturer: Kyocera International Inc. Electronic Components; ESR (Equivalent Series Resistance): 250 Ohms; Frequency Stability: ±30ppm; Frequency Tolerance: ±20ppm; Operating Mode: Fundamental; ComponentLink1Description: Datasheet; ComponentLink1URL: //media.digikey.com/pdf/Data%20Sheets/AVX%20PDFs/CX3225GB_Series_Spec.pdf; ComponentLink2Description: DigiKey Link; ComponentLink2URL: http://digikey.com/product-detail/en/kyocera-international-inc-electronic-components/CX3225GB13000P0HPQCC/1253-1170-1-ND/4454026; Frequency: 13MHz; Height - Seated (Max): 0.035" (0.90mm); LastUpdated: 9/2/2020 1:21:56 AM; Lifecycle Status: Active; Load Capacitance: 18pF; Minimum Order: 1; Mounting Type: Surface Mount; Operating Temperature: -40°C ~ 85°C; Package / Case: 4-SMD, No Lead; Packaging: TapeAndReel; PartId: 513; Part Status: Active; Price: 0.39; Series: CX3225GB, Kyocera; Size / Dimension: 0.126" L x 0.098" W (3.20mm x 2.50mm); Supplier 1: DigiKey; Supplier Part Number 1: 1253-1170-1-ND; Type: MHz Crystal; Value: 13MHz
footprint KYOCERA CX3225GB
pins: 1, 3

## CX3225GB13560P0HPQCC
designator Y?, comment 13.56MHz
CRYSTAL 13.5600MHZ 18PF SMD; Part Number: CX3225GB13560P0HPQCC; Manufacturer: Kyocera International Inc. Electronic Components; ESR (Equivalent Series Resistance): 250 Ohms; Frequency Stability: ±30ppm; Frequency Tolerance: ±20ppm; Operating Mode: Fundamental; ComponentLink1Description: Datasheet; ComponentLink1URL: //media.digikey.com/pdf/Data%20Sheets/AVX%20PDFs/CX3225GB_Series_Spec.pdf; ComponentLink2Description: DigiKey Link; ComponentLink2URL: http://digikey.com/product-detail/en/kyocera-international-inc-electronic-components/CX3225GB13560P0HPQCC/1253-1173-1-ND/4454027; Frequency: 13.56MHz; Height - Seated (Max): 0.035" (0.90mm); LastUpdated: 9/2/2020 1:21:56 AM; Lifecycle Status: Active; Load Capacitance: 18pF; Minimum Order: 1; Mounting Type: Surface Mount; Operating Temperature: -40°C ~ 85°C; Package / Case: 4-SMD, No Lead; Packaging: TapeAndReel; PartId: 512; Part Status: Active; Price: 0.39; Series: CX3225GB, Kyocera; Size / Dimension: 0.126" L x 0.098" W (3.20mm x 2.50mm); Supplier 1: DigiKey; Supplier Part Number 1: 1253-1173-1-ND; Type: MHz Crystal; Value: 13.56MHz
footprint KYOCERA CX3225GB
pins: 1, 3

## CX3225GB14745D0HPQCC
designator Y?, comment 14.7456MHz
CRYSTAL 14.7456MHZ 8PF SMD; Part Number: CX3225GB14745D0HPQCC; Manufacturer: Kyocera International Inc. Electronic Components; ESR (Equivalent Series Resistance): 100 Ohms; Frequency Stability: ±30ppm; Frequency Tolerance: ±20ppm; Operating Mode: Fundamental; ComponentLink1Description: Datasheet; ComponentLink1URL: //media.digikey.com/pdf/Data%20Sheets/AVX%20PDFs/CX3225GBxD0HPQCC_Series_Spec.pdf; ComponentLink2Description: DigiKey Link; ComponentLink2URL: http://digikey.com/product-detail/en/kyocera-international-inc-electronic-components/CX3225GB14745D0HPQCC/1253-1178-1-ND/4454006; Frequency: 14.7456MHz; Height - Seated (Max): 0.035" (0.90mm); LastUpdated: 9/2/2020 1:21:56 AM; Lifecycle Status: Active; Load Capacitance: 8pF; Minimum Order: 1; Mounting Type: Surface Mount; Operating Temperature: -40°C ~ 85°C; Package / Case: 4-SMD, No Lead; Packaging: TapeAndReel; PartId: 510; Part Status: Active; Price: 0.41; Series: CX3225GB, Kyocera; Size / Dimension: 0.126" L x 0.098" W (3.20mm x 2.50mm); Supplier 1: DigiKey; Supplier Part Number 1: 1253-1178-1-ND; Type: MHz Crystal; Value: 14.7456MHz
footprint KYOCERA CX3225GB
pins: 1, 3

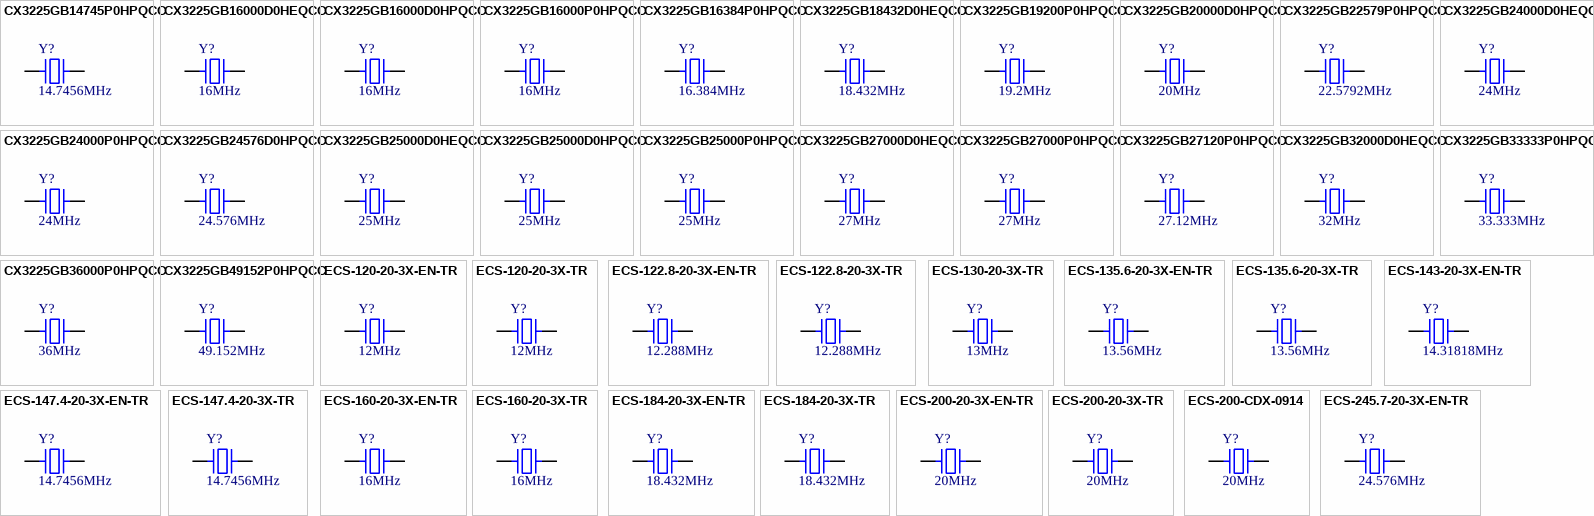
[diagram p13: symbols CX3225GB14745P0HPQCC to ECS-245.7-20-3X-EN-TR]

## CX3225GB14745P0HPQCC
designator Y?, comment 14.7456MHz
CRYSTAL 14.7456MHZ 18PF SMD; Part Number: CX3225GB14745P0HPQCC; Manufacturer: Kyocera International Inc. Electronic Components; ESR (Equivalent Series Resistance): 100 Ohms; Frequency Stability: ±30ppm; Frequency Tolerance: ±20ppm; Operating Mode: Fundamental; ComponentLink1Description: Datasheet; ComponentLink1URL: //media.digikey.com/pdf/Data%20Sheets/AVX%20PDFs/CX3225GB_Series_Spec.pdf; ComponentLink2Description: DigiKey Link; ComponentLink2URL: http://digikey.com/product-detail/en/kyocera-international-inc-electronic-components/CX3225GB14745P0HPQCC/1253-1179-1-ND/4454029; Frequency: 14.7456MHz; Height - Seated (Max): 0.035" (0.90mm); LastUpdated: 9/2/2020 1:21:57 AM; Lifecycle Status: Active; Load Capacitance: 18pF; Minimum Order: 1; Mounting Type: Surface Mount; Operating Temperature: -40°C ~ 85°C; Package / Case: 4-SMD, No Lead; Packaging: TapeAndReel; PartId: 496; Part Status: Active; Price: 0.39; Series: CX3225GB, Kyocera; Size / Dimension: 0.126" L x 0.098" W (3.20mm x 2.50mm); Supplier 1: DigiKey; Supplier Part Number 1: 1253-1179-1-ND; Type: MHz Crystal; Value: 14.7456MHz
footprint KYOCERA CX3225GB
pins: 1, 3

## CX3225GB16000D0HEQCC
designator Y?, comment 16MHz
CRYSTAL 16.0000MHZ 8PF SMD; Part Number: CX3225GB16000D0HEQCC; Manufacturer: Kyocera International Inc. Electronic Components; ESR (Equivalent Series Resistance): 80 Ohms; Frequency Stability: ±30ppm; Frequency Tolerance: ±20ppm; Operating Mode: Fundamental; ComponentLink1Description: Datasheet; ComponentLink1URL: //media.digikey.com/pdf/Data%20Sheets/AVX%20PDFs/CX3225GBxD0HEQ_Series_Spec.pdf; ComponentLink2Description: DigiKey Link; ComponentLink2URL: http://digikey.com/product-detail/en/kyocera-international-inc-electronic-components/CX3225GB16000D0HEQCC/1253-1180-1-ND/4453986; Frequency: 16MHz; Height - Seated (Max): 0.035" (0.90mm); LastUpdated: 9/2/2020 1:21:57 AM; Lifecycle Status: Active; Load Capacitance: 8pF; Minimum Order: 1; Mounting Type: Surface Mount; Operating Temperature: -10°C ~ 70°C; Package / Case: 4-SMD, No Lead; Packaging: TapeAndReel; PartId: 485; Part Status: Active; Price: 0.33; Series: CX3225GB, Kyocera; Size / Dimension: 0.126" L x 0.098" W (3.20mm x 2.50mm); Supplier 1: DigiKey; Supplier Part Number 1: 1253-1180-1-ND; Type: MHz Crystal; Value: 16MHz
footprint KYOCERA CX3225GB
pins: 1, 3

## CX3225GB16000D0HPQCC
designator Y?, comment 16MHz
CRYSTAL 16.0000MHZ 8PF SMD; Part Number: CX3225GB16000D0HPQCC; Manufacturer: Kyocera International Inc. Electronic Components; ESR (Equivalent Series Resistance): 80 Ohms; Frequency Stability: ±30ppm; Frequency Tolerance: ±20ppm; Operating Mode: Fundamental; ComponentLink1Description: Datasheet; ComponentLink1URL: //media.digikey.com/pdf/Data%20Sheets/AVX%20PDFs/CX3225GBxD0HPQCC_Series_Spec.pdf; ComponentLink2Description: DigiKey Link; ComponentLink2URL: http://digikey.com/product-detail/en/kyocera-international-inc-electronic-components/CX3225GB16000D0HPQCC/1253-1181-1-ND/4454007; Frequency: 16MHz; Height - Seated (Max): 0.035" (0.90mm); LastUpdated: 9/2/2020 1:21:57 AM; Lifecycle Status: Active; Load Capacitance: 8pF; Minimum Order: 1; Mounting Type: Surface Mount; Operating Temperature: -40°C ~ 85°C; Package / Case: 4-SMD, No Lead; Packaging: TapeAndReel; PartId: 488; Part Status: Active; Price: 0.35; Series: CX3225GB, Kyocera; Size / Dimension: 0.126" L x 0.098" W (3.20mm x 2.50mm); Supplier 1: DigiKey; Supplier Part Number 1: 1253-1181-1-ND; Type: MHz Crystal; Value: 16MHz
footprint KYOCERA CX3225GB
pins: 1, 3

## CX3225GB16000P0HPQCC
designator Y?, comment 16MHz